# Altium schematic symbol library LATTICEPLDS_Library.SchLib: 291 symbols (part 11 of 32) (continued)
## LFE2M-70-F900 (continued)
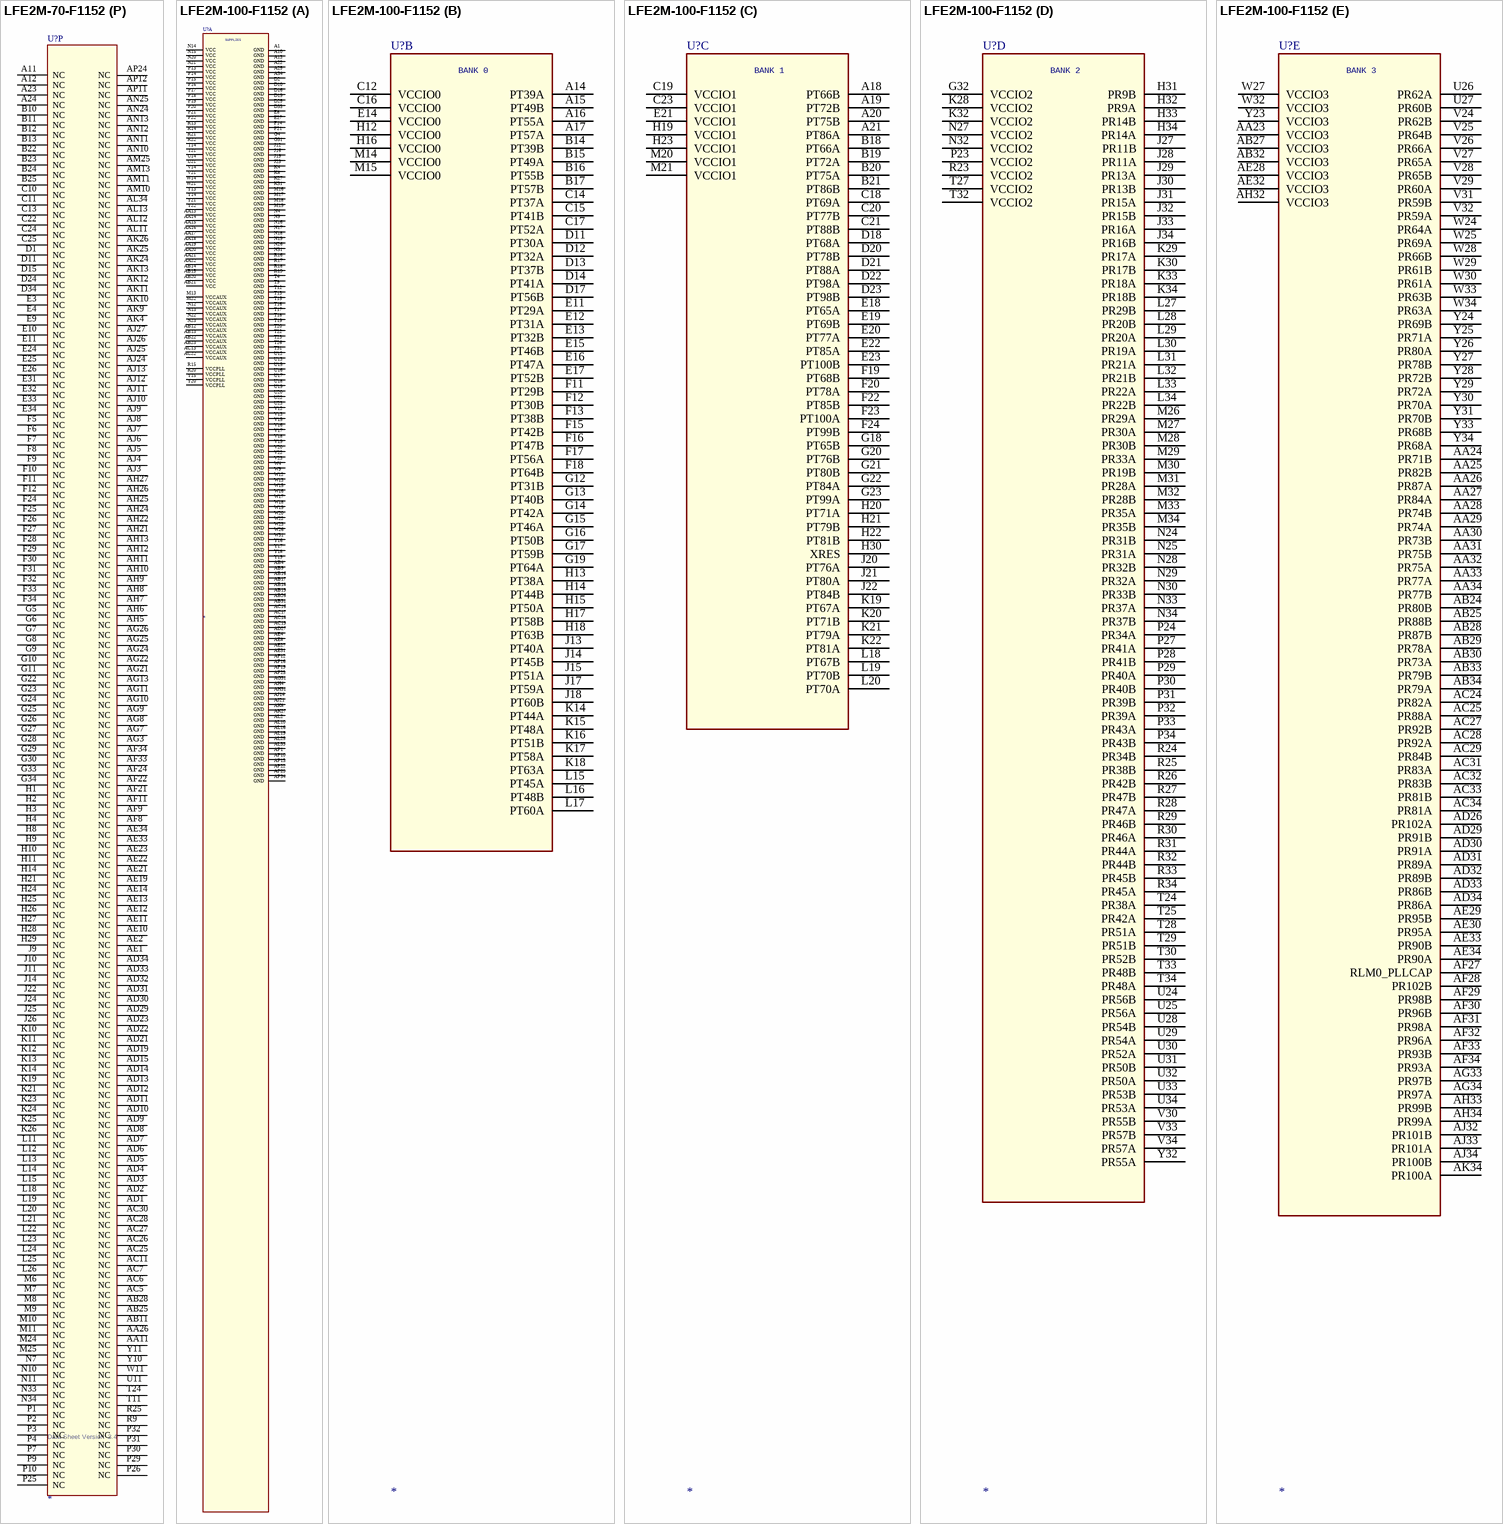
[diagram p117: symbols LFE2M-70-F1152 to LFE2M-100-F1152]
part A text: BANK7; BANK6; (1 of 10)
part B text: BANK5; BANK4; (2 of 10)
part C text: BANK3/BANK8; BANK2; (3 of 10)
part D text: BANK1; BANK0; (4 of 10)
part E text: (5 of 10)
part F text: SERDES4; (6 of 10)
part G text: SERDES3; (7 of 10)
part H text: SERDES2; (8 of 10)
part I text: SERDES1; (9 of 10)
part J text: VSS; (10 of 10)

## LFE2M-70-F1152
designator U?  Data Sheet Version: 3.4
SPLIT_INST: TRUE; SWAP_INFO: (S1+S2+S3+S4+S5+S6+S7+S8+S9+S10+S11+S12+S13+S14+S15)
part A pins: A1 GND (power), A10 GND (power), A13 GND (power), A22 GND (power), A25 GND (power), A34 GND (power), AA13 VCC (power), AA14 VCC (power), AA15 VCC (power), AA16 VCC (power), AA17 VCC (power), AA18 VCC (power), AA19 VCC (power), AA20 VCC (power), AA21 VCC (power), AA22 VCC (power), AB4 GND (power), AB9 GND (power), AB12 VCCAUX (power), AB13 VCCAUX (power), AB14 VCC (power), AB15 VCC (power), AB16 GND (power), AB17 GND (power), AB18 GND (power), AB19 GND (power), AB20 VCC (power), AB21 VCC (power), AB22 VCCAUX (power), AB23 VCCAUX (power), AB26 GND (power), AB31 GND (power), AC13 VCCAUX (power), AC16 GND (power), AC17 GND (power), AC18 GND (power), AC19 GND (power), AC22 VCCAUX (power), AD27 GND (power), AE4 GND (power), AE8 GND (power), AE27 GND (power), AE31 GND (power), AF12 GND (power), AF16 GND (power), AF19 GND (power), AF23 GND (power), AG31 GND (power), AH4 GND (power), AH31 GND (power), AJ14 GND (power), AJ21 GND (power), AK8 GND (power), AK27 GND (power), AL2 GND (power), AL10 GND (power), AL16 GND (power), AL19 GND (power), AL25 GND (power), AL33 GND (power), AP1 GND (power), AP10 GND (power), AP13 GND (power), AP22 GND (power), AP25 GND (power), AP34 GND (power), D2 GND (power), D10 GND (power), D16 GND (power), D19 GND (power), D25 GND (power), D33 GND (power), E8 GND (power), E27 GND (power), F14 GND (power), F21 GND (power), G4 GND (power), G31 GND (power), J12 GND (power), J16 GND (power), J19 GND (power), J23 GND (power), K4 GND (power), K8 GND (power), K27 GND (power), K31 GND (power), M13 VCCAUX (power), M16 GND (power), M17 GND (power), M18 GND (power), M19 GND (power), M22 VCCAUX (power), N4 GND (power), N9 GND (power), N12 VCCAUX (power), N13 VCCAUX (power), N14 VCC (power), N15 VCC (power), N16 GND (power), N17 GND (power), N18 GND (power), N19 GND (power), N20 VCC (power), N21 VCC (power), N22 VCCAUX (power), N23 VCCAUX (power), N26 GND (power), N31 GND (power), P13 VCC (power), P14 VCC (power), P15 VCC (power), P16 VCC (power), P17 VCC (power), P18 VCC (power), P19 VCC (power), P20 VCC (power), P21 VCC (power), P22 VCC (power), R13 VCC (power), R14 VCC (power), R15 VCCPLL (power), R16 GND (power), R17 GND (power), R18 GND (power), R19 GND (power), R20 VCCPLL (power), R21 VCC (power), R22 VCC (power), T4 GND (power), T9 GND (power), T12 GND (power), T13 GND (power), T14 VCC (power), T15 GND (power), T16 GND (power), T17 GND (power), T18 GND (power), T19 GND (power), T20 GND (power), T21 VCC (power), T22 GND (power), T23 GND (power), T26 GND (power), T31 GND (power), U12 GND (power), U13 GND (power), U14 VCC (power), U15 GND (power), U16 GND (power), U17 GND (power), U18 GND (power), U19 GND (power), U20 GND (power), U21 VCC (power), U22 GND (power), U23 GND (power), V12 GND (power), V13 GND (power), V14 VCC (power), V15 GND (power), V16 GND (power), V17 GND (power), V18 GND (power), V19 GND (power), V20 GND (power), V21 VCC (power), V22 GND (power), V23 GND (power), W4 GND (power), W9 GND (power), W12 GND (power), W13 GND (power), W14 VCC (power), W15 GND (power), W16 GND (power), W17 GND (power), W18 GND (power), W19 GND (power), W20 GND (power), W21 VCC (power), W22 GND (power), W23 GND (power), W26 GND (power), W31 GND (power), Y13 VCC (power), Y14 VCC (power), Y15 VCCPLL (power), Y16 GND (power), Y17 GND (power), Y18 GND (power), Y19 GND (power), Y20 VCCPLL (power), Y21 VCC (power), Y22 VCC (power)
part B pins: A14 PT35A, A15 PT44B, A16 PT48A, A17 PT50A, B14 PT35B, B15 PT44A, B16 PT48B, B17 PT50B, C12 VCCIO0 (power), C14 PT33A, C15 PT37B, C16 VCCIO0 (power), C17 PT47A, D12 PT32A, D13 PT33B, D14 PT37A, D17 PT49B, E12 PT31A, E13 PT32B, E14 VCCIO0 (power), E15 PT41B, E16 PT42A, E17 PT47B, F13 PT34B, F15 PT38B, F16 PT42B, F17 PT49A, F18 PT55B, G12 PT31B, G13 PT36B, G14 PT38A, G15 PT41A, G16 PT45B, G17 PT52B, G19 PT55A, H12 VCCIO0 (power), H13 PT34A, H15 PT45A, H16 VCCIO0 (power), H17 PT51B, H18 PT54B, J13 PT36A, J15 PT46A, J17 PT52A, J18 PT53B, K15 PT43A, K16 PT46B, K17 PT51A, K18 PT54A, L16 PT43B, L17 PT53A, M14 VCCIO0 (power), M15 VCCIO0 (power)
part C pins: A18 PT57B, A19 PT63B, A20 PT66B, A21 PT77A, B18 PT57A, B19 PT63A, B20 PT66A, B21 PT77B, C18 PT60A, C19 VCCIO1 (power), C20 PT68B, C21 PT79B, C23 VCCIO1 (power), D18 PT59A, D20 PT69B, D21 PT79A, D22 PT80A, D23 PT80B, E18 PT56A, E19 PT60B, E20 PT68A, E21 VCCIO1 (power), E22 PT76A, E23 PT82B, F19 PT59B, F20 PT69A, F22 PT76B, F23 PT82A, G18 PT56B, G20 PT67B, G21 PT71B, H19 VCCIO1 (power), H20 PT62A, H22 PT72B, H23 VCCIO1 (power), H30 XRES, J20 PT67A, J21 PT71A, K20 PT62B, K22 PT72A, M20 VCCIO1 (power), M21 VCCIO1 (power)
part D pins: G32 VCCIO2 (power), H31 PR9B, H32 PR9A, H33 PR14B, H34 PR14A, J27 PR11B, J28 PR11A, J29 PR13A, J30 PR13B, J31 PR15A, J32 PR15B, J33 PR16A, J34 PR16B, K28 VCCIO2 (power), K29 PR17A, K30 PR17B, K32 VCCIO2 (power), K33 PR18A, K34 PR18B, L27 PR25B, L28 PR20B, L29 PR20A, L30 PR19A, L31 PR21A, L32 PR21B, L33 PR22A, L34 PR22B, M26 PR25A, M27 PR26A, M28 PR26B, M29 PR29A, M30 PR19B, M31 PR24A, M32 PR24B, M33 PR31A, M34 PR31B, N24 PR27B, N25 PR27A, N27 VCCIO2 (power), N28 PR28B, N29 PR28A, N30 PR29B, N32 VCCIO2 (power), P23 VCCIO2 (power), P24 PR30A, P27 PR33A, P28 PR33B, P33 PR35A, P34 PR35B, R23 VCCIO2 (power), R24 PR30B, R26 PR34B, R27 PR39B, R28 PR39A, R29 PR38B, R30 PR38A, R31 PR36A, R32 PR36B, R33 PR37B, R34 PR37A, T25 PR34A, T27 VCCIO2 (power), T28 PR43A, T29 PR43B, T30 PR44B, T32 VCCIO2 (power), T33 PR40B, T34 PR40A, U24 PR48B, U25 PR48A, U28 PR46B, U29 PR46A, U30 PR44A, U31 PR42B, U32 PR42A, U33 PR45B, U34 PR45A, V30 PR47B, V33 PR49B, V34 PR49A, Y32 PR47A
part E pins: AA23 VCCIO3 (power), AA24 PR63B, AA25 PR74B, AA27 PR76A, AA28 PR66B, AA29 PR66A, AA30 PR65B, AA31 PR67B, AA32 PR67A, AA33 PR69A, AA34 PR69B, AB24 PR72B, AB27 VCCIO3 (power), AB29 PR70A, AB30 PR65A, AB32 VCCIO3 (power), AB33 PR71B, AB34 PR71A, AC24 PR74A, AC29 PR76B, AC31 PR75A, AC32 PR75B, AC33 PR73B, AC34 PR73A, AD26 PR85A, AE28 VCCIO3 (power), AE29 PR78B, AE30 PR78A, AE32 VCCIO3 (power), AF27 RLM0_PLLCAP, AF28 PR85B, AF29 PR81B, AF30 PR79B, AF31 PR81A, AF32 PR79A, AG33 PR80B, AG34 PR80A, AH32 VCCIO3 (power), AH33 PR82B, AH34 PR82A, AJ32 PR84B, AJ33 PR84A, AJ34 PR83B, AK34 PR83A, U26 PR54A, U27 PR52B, V24 PR54B, V25 PR56B, V26 PR58A, V27 PR57A, V28 PR57B, V29 PR52A, V31 PR51B, V32 PR51A, W24 PR56A, W25 PR61A, W27 VCCIO3 (power), W28 PR58B, W29 PR53B, W30 PR53A, W32 VCCIO3 (power), W33 PR55B, W34 PR55A, Y23 VCCIO3 (power), Y24 PR61B, Y25 PR63A, Y26 PR72A, Y27 PR70B, Y28 PR64B, Y29 PR64A, Y30 PR62A, Y31 PR62B, Y33 PR60B, Y34 PR60A
part F pins: AC20 VCCIO4 (power), AC21 VCCIO4 (power), AD18 PB58B, AD20 PB71A, AE18 PB62B, AE20 PB73A, AF18 PB58A, AF20 PB71B, AG18 PB62A, AG19 VCCIO4 (power), AG20 PB73B, AG23 VCCIO4 (power), AH18 PB63B, AH19 PB69A, AH20 PB72B, AH23 PB81B, AJ18 PB63A, AJ19 PB72A, AJ20 PB69B, AJ22 PB79B, AJ23 PB81A, AK18 PB64A, AK19 PB64B, AK20 PB66B, AK21 VCCIO4 (power), AK22 PB79A, AK23 PB80B, AL20 PB66A, AL21 PB67B, AL22 PB74B, AL23 PB80A, AL24 PB78B, AM19 VCCIO4 (power), AM20 PB60B, AM21 PB61B, AM22 PB74A, AM23 VCCIO4 (power), AM24 PB78A, AN19 PB59B, AN20 PB61A, AN21 PB65B, AN22 PB67A, AN23 PB77B, AP19 PB59A, AP20 PB60A, AP21 PB65A, AP23 PB77A
part G pins: AC14 VCCIO5 (power), AC15 VCCIO5 (power), AD16 PB44B, AD17 PB49A, AE15 PB36A, AE16 PB42B, AE17 PB49B, AF13 PB35B, AF14 PB35A, AF15 PB44A, AF17 PB53A, AG12 VCCIO5 (power), AG14 PB36B, AG15 PB42A, AG16 VCCIO5 (power), AG17 PB52A, AH14 PB31A, AH15 PB37A, AH16 PB45B, AH17 PB53B, AJ15 PB31B, AJ16 PB39B, AJ17 PB52B, AK14 VCCIO5 (power), AK15 PB37B, AK16 PB39A, AK17 PB45A, AL14 PB33A, AL15 PB38A, AL17 PB47A, AL18 PB50A, AM12 VCCIO5 (power), AM14 PB33B, AM15 PB38B, AM16 VCCIO5 (power), AM17 PB47B, AM18 PB50B, AN14 PB30A, AN15 PB40A, AN16 PB46A, AN17 PB48A, AN18 PB51B, AP14 PB30B, AP15 PB40B, AP16 PB46B, AP17 PB48B, AP18 PB51A
part H pins: AA1 PL64A, AA2 PL64B, AA3 PL67B, AA4 PL67A, AA5 PL70A, AA6 PL66A, AA7 PL66B, AA8 PL65A, AA9 PL69A, AA10 PL69B, AA12 VCCIO6 (power), AB1 PL71A, AB2 PL71B, AB3 VCCIO6 (power), AB5 PL74B, AB6 PL70B, AB7 PL74A, AB8 VCCIO6 (power), AB10 PL72B, AC1 PL73A, AC2 PL73B, AC3 PL75A, AC4 PL75B, AC8 PL72A, AC9 PL76B, AC10 PL76A, AE3 VCCIO6 (power), AE5 PL79A, AE6 PL79B, AE7 VCCIO6 (power), AE9 PL83A, AF1 PL78B, AF2 PL78A, AF3 PL80B, AF4 PL80A, AF5 PL81A, AF6 PL81B, AF7 PL83B, AG1 PL82A, AG2 PL82B, AG4 PL85B, AG5 PL85A, AG6 LLM0_PLLCAP, AH1 PL84A, AH2 PL84B, AH3 VCCIO6 (power), AJ1 PL87A, AJ2 PL87B, U1 PL51B, U2 PL51A, V1 PL55B, V2 PL55A, V3 PL54B, V4 PL54A, V5 PL52A, V6 PL52B, V7 PL53A, V8 PL53B, W1 PL57B, W2 PL57A, W3 VCCIO6 (power), W5 PL56B, W6 PL58B, W7 PL56A, W8 VCCIO6 (power), W10 PL62A, Y1 PL60A, Y2 PL60B, Y3 PL63B, Y4 PL63A, Y5 PL61B, Y6 PL58A, Y7 PL61A, Y8 PL62B, Y9 PL65B, Y12 VCCIO6 (power)
part I pins: E1 PL11A, E2 PL11B, F1 PL13A, F2 PL13B, F3 PL9B, F4 PL9A, G1 PL15B, G2 PL15A, G3 VCCIO7 (power), H5 PL18A, H6 PL14B, H7 PL12B, J1 PL19B, J2 PL19A, J3 PL21B, J4 PL21A, J5 PL22A, J6 PL18B, J7 PL16A, J8 PL14A, K1 PL20B, K2 PL20A, K3 VCCIO7 (power), K5 PL22B, K6 PL25B, K7 VCCIO7 (power), K9 PL12A, L1 PL24B, L2 PL24A, L3 PL28A, L4 PL28B, L5 PL27B, L6 PL27A, L7 PL25A, L8 PL16B, L9 PL17A, L10 PL17B, M1 PL26B, M2 PL26A, M3 PL29A, M4 PL29B, M5 PL31A, N1 PL30A, N2 PL30B, N3 VCCIO7 (power), N5 PL33B, N6 PL31B, N8 VCCIO7 (power), P5 PL33A, P6 PL34B, P8 PL34A, P11 PL36B, P12 VCCIO7 (power), R1 PL39A, R2 PL39B, R3 PL35A, R4 PL35B, R5 PL38A, R6 PL44B, R7 PL37A, R8 PL37B, R10 PL36A, R11 PL40A, R12 VCCIO7 (power), T1 PL42A, T2 PL42B, T3 VCCIO7 (power), T5 PL38B, T6 PL44A, T7 PL45B, T8 VCCIO7 (power), T10 PL40B, U3 PL49B, U4 PL49A, U5 PL46A, U6 PL46B, U7 PL47A, U8 PL43B, U9 PL45A, U10 PL43A, V9 PL47B, V10 PL48B, V11 PL48A
part J pins: AD24 CFG1, AD25 CSN, AD28 VCCIO8 (power), AE24 WRITEN, AE25 INITN, AE26 D6, AF25 PROGRAMN, AF26 D4, AG27 DI, AG28 D1, AG29 D0, AG30 D2, AG32 VCCIO8 (power), AH28 CFG2, AH29 D3, AH30 D5, AJ28 CCLK, AJ29 CFG0, AJ30 CS1N, AJ31 D7, AK31 DONE, AK32 DOUT_CSON, AK33 BUSY
part K pins: AF10 TDO, AK1 TDI, AK2 TCK (in), AK3 VCCJ, AL1 TMS
part L pins: A2 ULC_SQ_HDOUTP3, A3 ULC_SQ_HDOUTN3, A4 ULC_SQ_HDOUTN2, A5 ULC_SQ_HDOUTP2, A6 ULC_SQ_HDOUTP1, A7 ULC_SQ_HDOUTN1, A8 ULC_SQ_HDOUTN0, A9 ULC_SQ_HDOUTP0, B1 ULC_SQ_VCCIB3, B2 ULC_SQ_VCCRX3, B3 ULC_SQ_VCCTX3, B4 ULC_SQ_VCCTX2, B5 ULC_SQ_VCCRX2, B6 ULC_SQ_VCCRX1, B7 ULC_SQ_VCCTX1, B8 ULC_SQ_VCCTX0, B9 ULC_SQ_VCCIB0, C1 ULC_SQ_VCCOB3, C2 ULC_SQ_HDINP3, C3 ULC_SQ_HDINN3, C4 ULC_SQ_HDINN2, C5 ULC_SQ_HDINP2, C6 ULC_SQ_HDINP1, C7 ULC_SQ_HDINN1, C8 ULC_SQ_HDINN0, C9 ULC_SQ_HDINP0, D3 ULC_SQ_VCCOB2, D4 ULC_SQ_VCCIB2, D5 ULC_SQ_REFCLKP, D6 ULC_SQ_VCCP, D7 ULC_SQ_VCCRX0, D8 ULC_SQ_VCCIB1, D9 ULC_SQ_VCCOB0, E5 ULC_SQ_REFCLKN, E6 ULC_SQ_VCCAUX33, E7 ULC_SQ_VCCOB1
part M pins: A26 URC_SQ_HDOUTP3, A27 URC_SQ_HDOUTN3, A28 URC_SQ_HDOUTN2, A29 URC_SQ_HDOUTP2, A30 URC_SQ_HDOUTP1, A31 URC_SQ_HDOUTN1, A32 URC_SQ_HDOUTN0, A33 URC_SQ_HDOUTP0, B26 URC_SQ_VCCIB3, B27 URC_SQ_VCCTX3, B28 URC_SQ_VCCTX2, B29 URC_SQ_VCCRX2, B30 URC_SQ_VCCRX1, B31 URC_SQ_VCCTX1, B32 URC_SQ_VCCTX0, B33 URC_SQ_VCCRX0, B34 URC_SQ_VCCIB0, C26 URC_SQ_HDINP3, C27 URC_SQ_HDINN3, C28 URC_SQ_HDINN2, C29 URC_SQ_HDINP2, C30 URC_SQ_HDINP1, C31 URC_SQ_HDINN1, C32 URC_SQ_HDINN0, C33 URC_SQ_HDINP0, C34 URC_SQ_VCCOB0, D26 URC_SQ_VCCOB3, D27 URC_SQ_VCCIB2, D28 URC_SQ_VCCRX3, D29 URC_SQ_VCCP, D30 URC_SQ_REFCLKP, D31 URC_SQ_VCCIB1, D32 URC_SQ_VCCOB1, E28 URC_SQ_VCCOB2, E29 URC_SQ_VCCAUX33, E30 URC_SQ_REFCLKN
part N pins: AK28 LRC_SQ_VCCOB2, AK29 LRC_SQ_VCCAUX33, AK30 LRC_SQ_REFCLKN, AL26 LRC_SQ_VCCOB3, AL27 LRC_SQ_VCCIB2, AL28 LRC_SQ_VCCRX3, AL29 LRC_SQ_VCCP, AL30 LRC_SQ_REFCLKP, AL31 LRC_SQ_VCCIB1, AL32 LRC_SQ_VCCOB1, AM26 LRC_SQ_HDINP3, AM27 LRC_SQ_HDINN3, AM28 LRC_SQ_HDINN2, AM29 LRC_SQ_HDINP2, AM30 LRC_SQ_HDINP1, AM31 LRC_SQ_HDINN1, AM32 LRC_SQ_HDINN0, AM33 LRC_SQ_HDINP0, AM34 LRC_SQ_VCCOB0, AN26 LRC_SQ_VCCIB3, AN27 LRC_SQ_VCCTX3, AN28 LRC_SQ_VCCTX2, AN29 LRC_SQ_VCCRX2, AN30 LRC_SQ_VCCRX1, AN31 LRC_SQ_VCCTX1, AN32 LRC_SQ_VCCTX0, AN33 LRC_SQ_VCCRX0, AN34 LRC_SQ_VCCIB0, AP26 LRC_SQ_HDOUTP3, AP27 LRC_SQ_HDOUTN3, AP28 LRC_SQ_HDOUTN2, AP29 LRC_SQ_HDOUTP2, AP30 LRC_SQ_HDOUTP1, AP31 LRC_SQ_HDOUTN1, AP32 LRC_SQ_HDOUTN0, AP33 LRC_SQ_HDOUTP0
part O pins: AK5 LLC_SQ_REFCLKN, AK6 LLC_SQ_VCCAUX33, AK7 LLC_SQ_VCCOB1, AL3 LLC_SQ_VCCOB2, AL4 LLC_SQ_VCCIB2, AL5 LLC_SQ_REFCLKP, AL6 LLC_SQ_VCCP, AL7 LLC_SQ_VCCRX0, AL8 LLC_SQ_VCCIB1, AL9 LLC_SQ_VCCOB0, AM1 LLC_SQ_VCCOB3, AM2 LLC_SQ_HDINP3, AM3 LLC_SQ_HDINN3, AM4 LLC_SQ_HDINN2, AM5 LLC_SQ_HDINP2, AM6 LLC_SQ_HDINP1, AM7 LLC_SQ_HDINN1, AM8 LLC_SQ_HDINN0, AM9 LLC_SQ_HDINP0, AN1 LLC_SQ_VCCIB3, AN2 LLC_SQ_VCCRX3, AN3 LLC_SQ_VCCTX3, AN4 LLC_SQ_VCCTX2, AN5 LLC_SQ_VCCRX2, AN6 LLC_SQ_VCCRX1, AN7 LLC_SQ_VCCTX1, AN8 LLC_SQ_VCCTX0, AN9 LLC_SQ_VCCIB0, AP2 LLC_SQ_HDOUTP3, AP3 LLC_SQ_HDOUTN3, AP4 LLC_SQ_HDOUTN2, AP5 LLC_SQ_HDOUTP2, AP6 LLC_SQ_HDOUTP1, AP7 LLC_SQ_HDOUTN1, AP8 LLC_SQ_HDOUTN0, AP9 LLC_SQ_HDOUTP0
part P pins: A11 NC, A12 NC, A23 NC, A24 NC, AA11 NC, AA26 NC, AB11 NC, AB25 NC, AB28 NC, AC5 NC, AC6 NC, AC7 NC, AC11 NC, AC25 NC, AC26 NC, AC27 NC, AC28 NC, AC30 NC, AD1 NC, AD2 NC, AD3 NC, AD4 NC, AD5 NC, AD6 NC, AD7 NC, AD8 NC, AD9 NC, AD10 NC, AD11 NC, AD12 NC, AD13 NC, AD14 NC, AD15 NC, AD19 NC, AD21 NC, AD22 NC, AD23 NC, AD29 NC, AD30 NC, AD31 NC, AD32 NC, AD33 NC, AD34 NC, AE1 NC, AE2 NC, AE10 NC, AE11 NC, AE12 NC, AE13 NC, AE14 NC, AE19 NC, AE21 NC, AE22 NC, AE23 NC, AE33 NC, AE34 NC, AF8 NC, AF9 NC, AF11 NC, AF21 NC, AF22 NC, AF24 NC, AF33 NC, AF34 NC, AG3 NC, AG7 NC, AG8 NC, AG9 NC, AG10 NC, AG11 NC, AG13 NC, AG21 NC, AG22 NC, AG24 NC, AG25 NC, AG26 NC, AH5 NC, AH6 NC, AH7 NC, AH8 NC, AH9 NC, AH10 NC, AH11 NC, AH12 NC, AH13 NC, AH21 NC, AH22 NC, AH24 NC, AH25 NC, AH26 NC, AH27 NC, AJ3 NC, AJ4 NC, AJ5 NC, AJ6 NC, AJ7 NC, AJ8 NC, AJ9 NC, AJ10 NC, AJ11 NC, AJ12 NC, AJ13 NC, AJ24 NC, AJ25 NC, AJ26 NC, AJ27 NC, AK4 NC, AK9 NC, AK10 NC, AK11 NC, AK12 NC, AK13 NC, AK24 NC, AK25 NC, AK26 NC, AL11 NC, AL12 NC, AL13 NC, AL34 NC, AM10 NC, AM11 NC, AM13 NC, AM25 NC, AN10 NC, AN11 NC, AN12 NC, AN13 NC, AN24 NC, AN25 NC, AP11 NC, AP12 NC, AP24 NC, B10 NC, B11 NC, B12 NC, B13 NC, B22 NC, B23 NC, B24 NC, B25 NC, C10 NC, C11 NC, C13 NC, C22 NC, C24 NC, C25 NC, D1 NC, D11 NC, D15 NC, D24 NC, D34 NC, E3 NC, E4 NC, E9 NC, E10 NC, E11 NC, E24 NC, E25 NC, E26 NC, E31 NC, E32 NC, E33 NC, E34 NC, F5 NC, F6 NC, F7 NC, F8 NC, F9 NC, F10 NC, F11 NC, F12 NC, F24 NC, F25 NC, F26 NC, F27 NC, F28 NC, F29 NC, F30 NC, F31 NC, F32 NC, F33 NC, F34 NC, G5 NC, G6 NC, G7 NC, G8 NC, G9 NC, G10 NC, G11 NC, G22 NC, G23 NC, G24 NC, G25 NC, G26 NC, G27 NC, G28 NC, G29 NC, G30 NC, G33 NC, G34 NC, H1 NC, H2 NC, H3 NC, H4 NC, H8 NC, H9 NC, H10 NC, H11 NC, H14 NC, H21 NC, H24 NC, H25 NC, H26 NC, H27 NC, H28 NC, H29 NC, J9 NC, J10 NC, J11 NC, J14 NC, J22 NC, J24 NC, J25 NC, J26 NC, K10 NC, K11 NC, K12 NC, K13 NC, K14 NC, K19 NC, K21 NC, K23 NC, K24 NC, K25 NC, K26 NC, L11 NC, L12 NC, L13 NC, L14 NC, L15 NC, L18 NC, L19 NC, L20 NC, L21 NC, L22 NC, L23 NC, L24 NC, L25 NC, L26 NC, M6 NC, M7 NC, M8 NC, M9 NC, M10 NC, M11 NC, M24 NC, M25 NC, N7 NC, N10 NC, N11 NC, N33 NC, N34 NC, P1 NC, P2 NC, P3 NC, P4 NC, P7 NC, P9 NC, P10 NC, P25 NC, P26 NC, P29 NC, P30 NC, P31 NC, P32 NC, R9 NC, R25 NC, T11 NC, T24 NC, U11 NC, W11 NC, Y10 NC, Y11 NC
part A text: SUPPLIES
part B text: BANK 0
part C text: BANK 1
part D text: BANK 2
part E text: BANK 3
part F text: BANK 4
part G text: BANK 5
part H text: BANK 6
part I text: BANK 7
part J text: BANK 8
part K text: JTAG
part L text: SERDES
part M text: SERDES
part N text: SERDES
part O text: SERDES

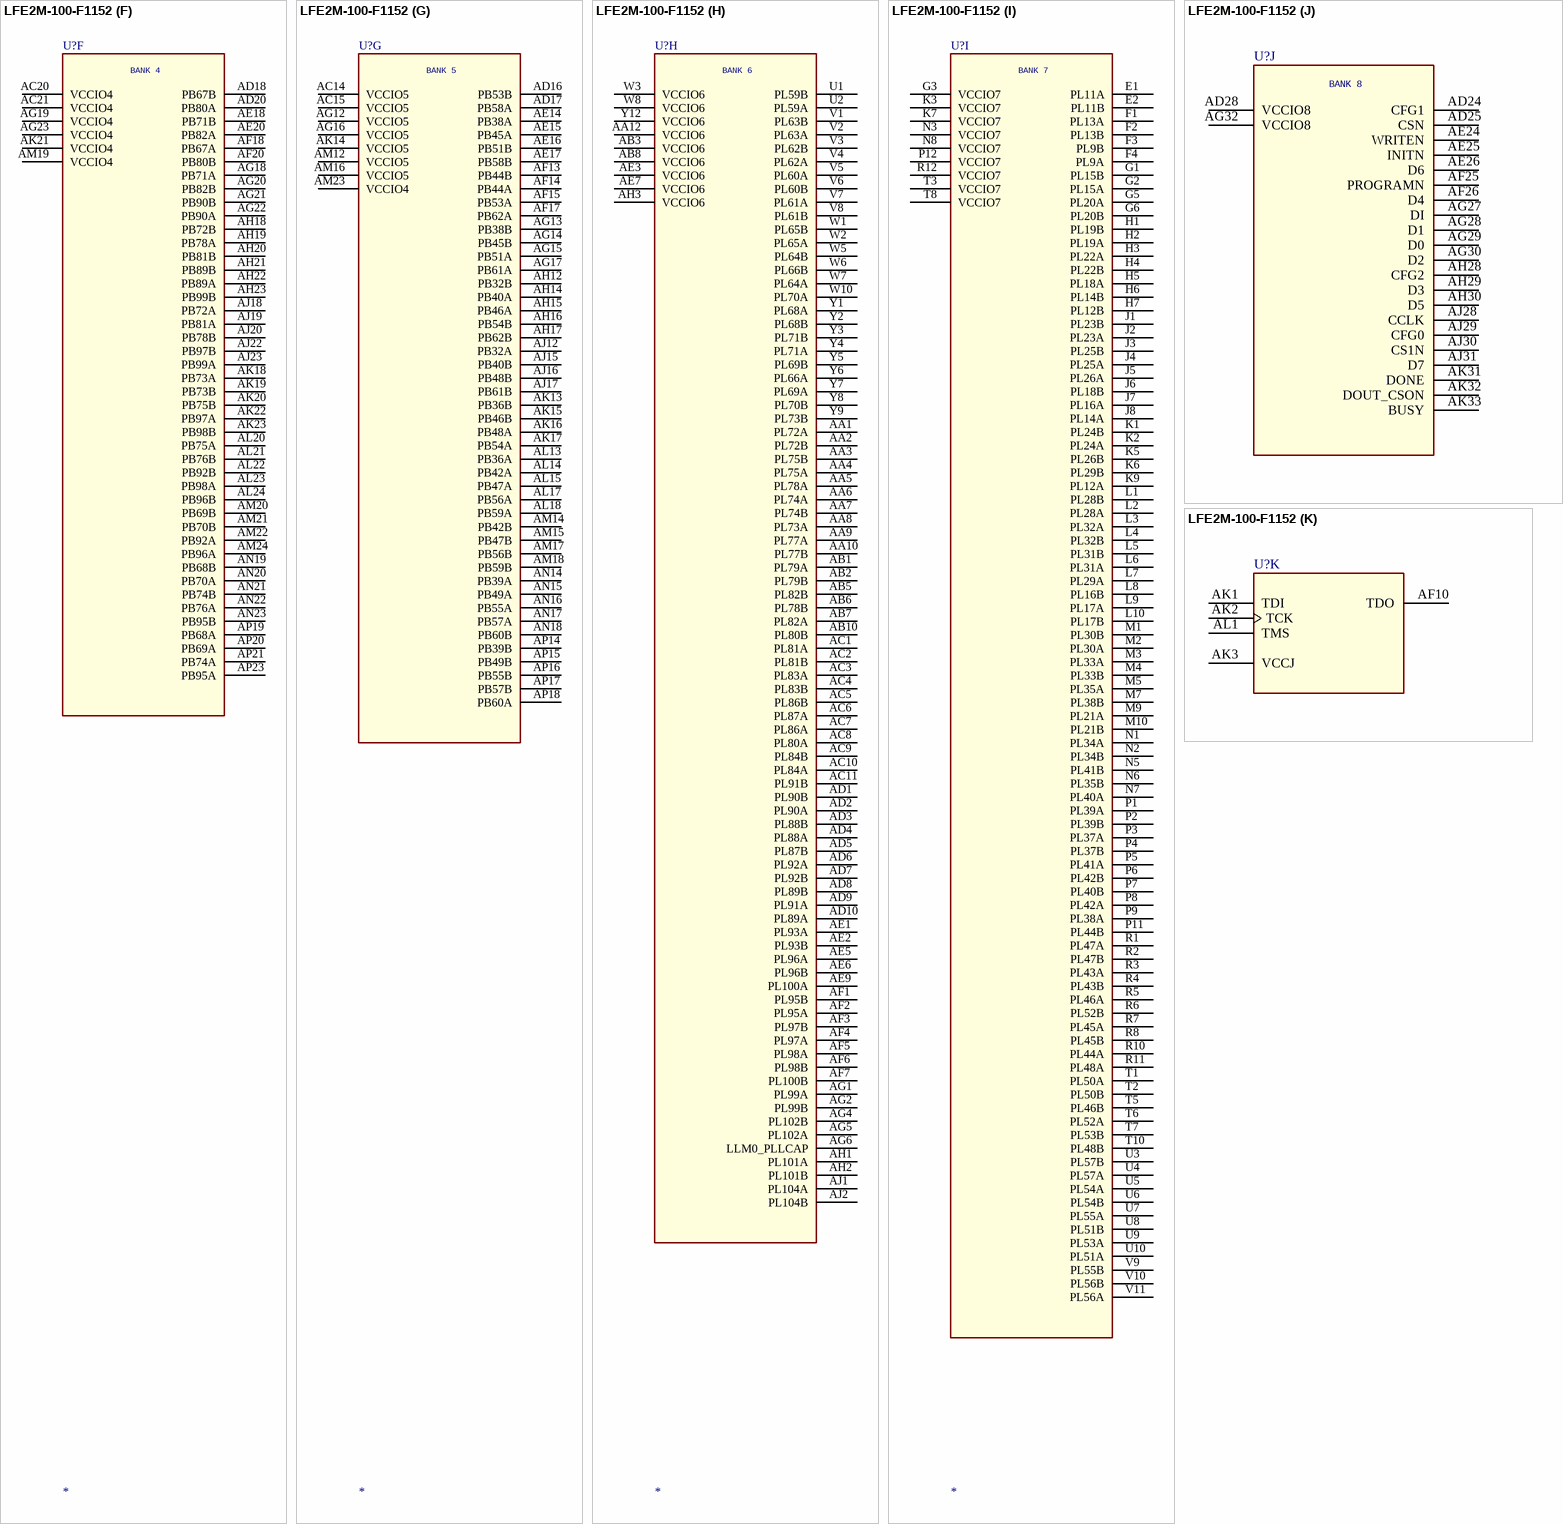
[diagram p118: symbol LFE2M-100-F1152]

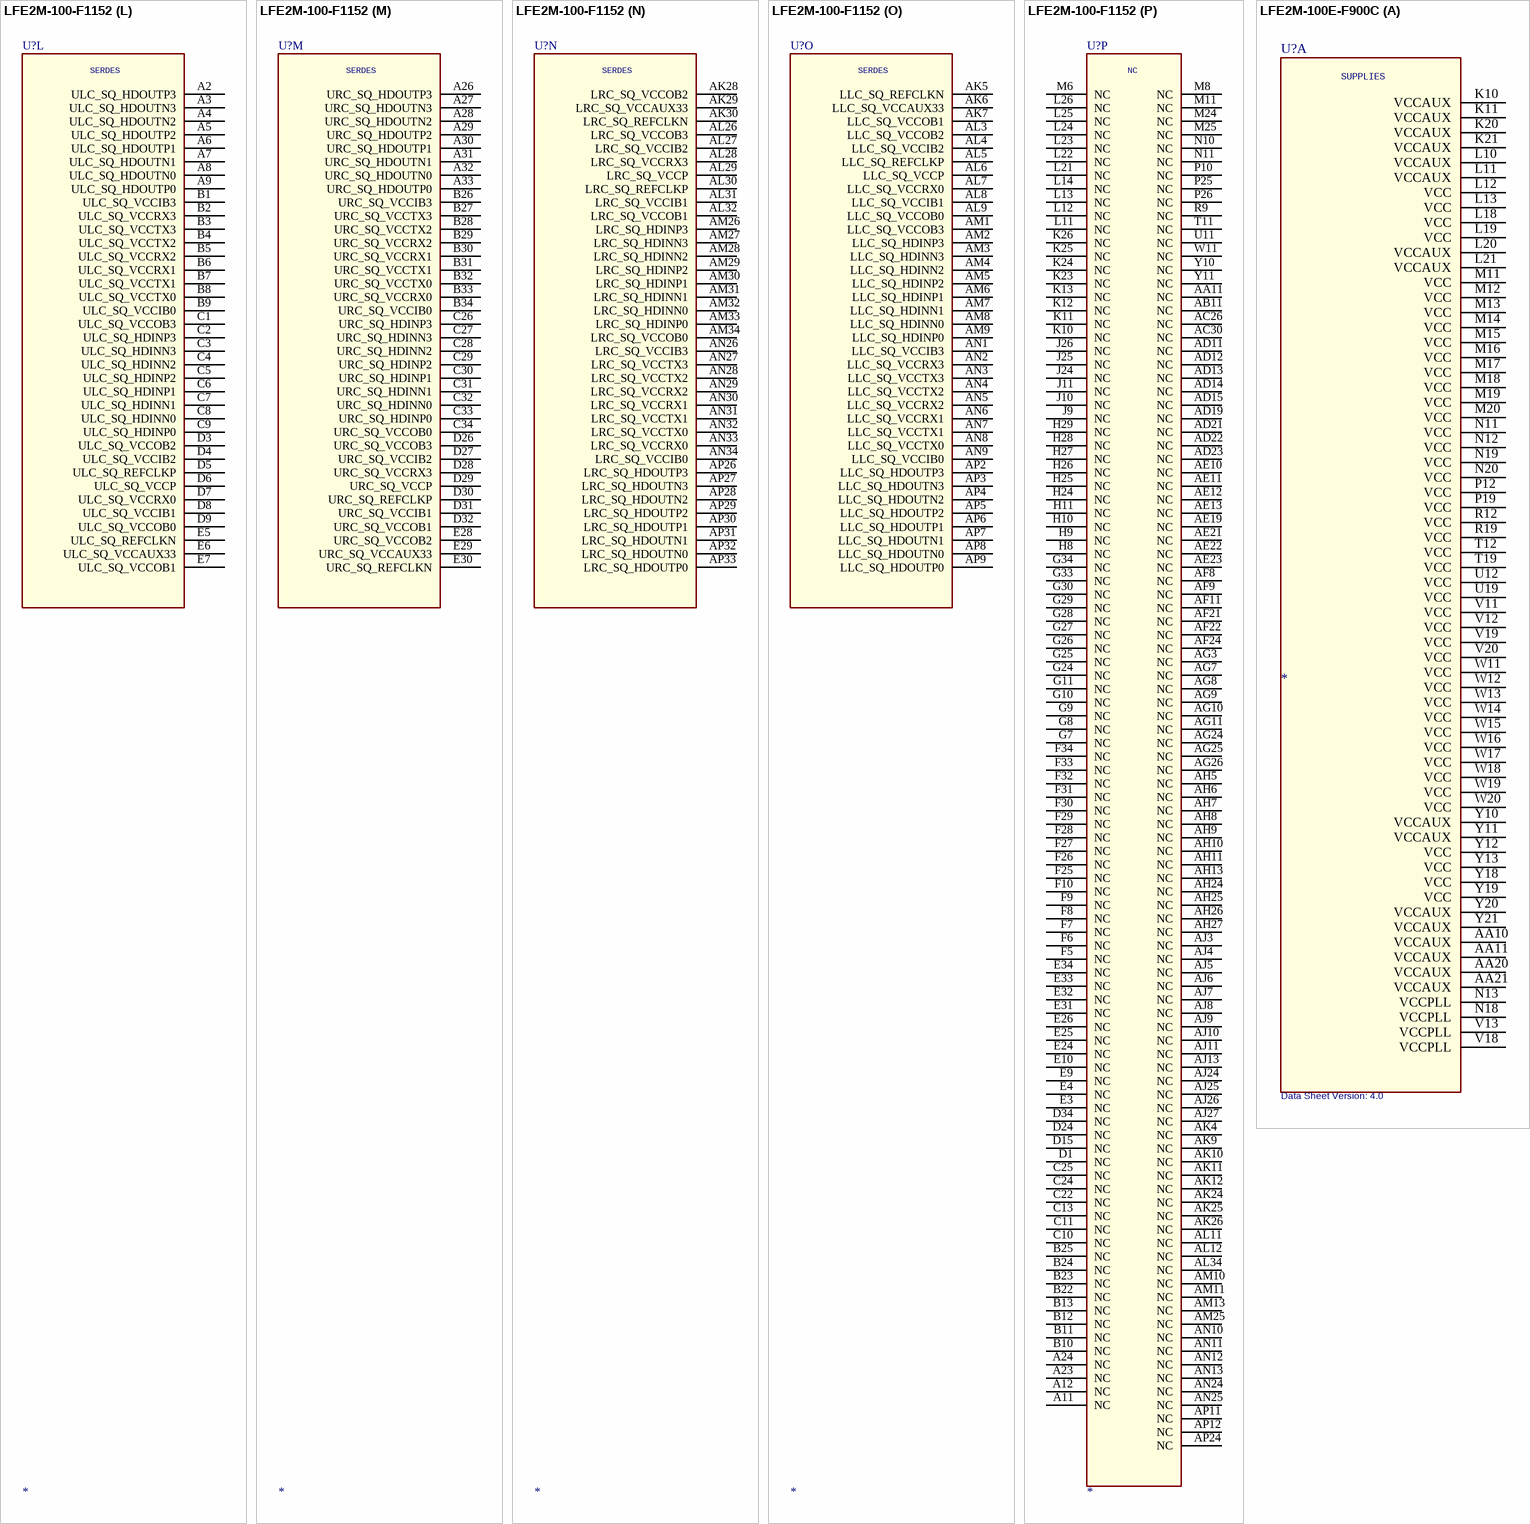
[diagram p119: symbols LFE2M-100-F1152 to LFE2M-100E-F900C]

## LFE2M-100-F1152
designator U?
SWAP_INFO: (S1+S2+S3+S4+S5+S6+S7+S8+S9+S10+S11+S12+S13+S14+S15); SPLIT_INST: TRUE
part A pins: A1 GND (power), A10 GND (power), A13 GND (power), A22 GND (power), A25 GND (power), A34 GND (power), AA13 VCC (power), AA14 VCC (power), AA15 VCC (power), AA16 VCC (power), AA17 VCC (power), AA18 VCC (power), AA19 VCC (power), AA20 VCC (power), AA21 VCC (power), AA22 VCC (power), AB4 GND (power), AB9 GND (power), AB12 VCCAUX (power), AB13 VCCAUX (power), AB14 VCC (power), AB15 VCC (power), AB16 GND (power), AB17 GND (power), AB18 GND (power), AB19 GND (power), AB20 VCC (power), AB21 VCC (power), AB22 VCCAUX (power), AB23 VCCAUX (power), AB26 GND (power), AB31 GND (power), AC13 VCCAUX (power), AC16 GND (power), AC17 GND (power), AC18 GND (power), AC19 GND (power), AC22 VCCAUX (power), AD27 GND (power), AE4 GND (power), AE8 GND (power), AE27 GND (power), AE31 GND (power), AF12 GND (power), AF16 GND (power), AF19 GND (power), AF23 GND (power), AG31 GND (power), AH4 GND (power), AH31 GND (power), AJ14 GND (power), AJ21 GND (power), AK8 GND (power), AK27 GND (power), AL2 GND (power), AL10 GND (power), AL16 GND (power), AL19 GND (power), AL25 GND (power), AL33 GND (power), AP1 GND (power), AP10 GND (power), AP13 GND (power), AP22 GND (power), AP25 GND (power), AP34 GND (power), D2 GND (power), D10 GND (power), D16 GND (power), D19 GND (power), D25 GND (power), D33 GND (power), E8 GND (power), E27 GND (power), F14 GND (power), F21 GND (power), G4 GND (power), G31 GND (power), J12 GND (power), J16 GND (power), J19 GND (power), J23 GND (power), K4 GND (power), K8 GND (power), K27 GND (power), K31 GND (power), M13 VCCAUX (power), M16 GND (power), M17 GND (power), M18 GND (power), M19 GND (power), M22 VCCAUX (power), N4 GND (power), N9 GND (power), N12 VCCAUX (power), N13 VCCAUX (power), N14 VCC (power), N15 VCC (power), N16 GND (power), N17 GND (power), N18 GND (power), N19 GND (power), N20 VCC (power), N21 VCC (power), N22 VCCAUX (power), N23 VCCAUX (power), N26 GND (power), N31 GND (power), P13 VCC (power), P14 VCC (power), P15 VCC (power), P16 VCC (power), P17 VCC (power), P18 VCC (power), P19 VCC (power), P20 VCC (power), P21 VCC (power), P22 VCC (power), R13 VCC (power), R14 VCC (power), R15 VCCPLL (power), R16 GND (power), R17 GND (power), R18 GND (power), R19 GND (power), R20 VCCPLL (power), R21 VCC (power), R22 VCC (power), T4 GND (power), T9 GND (power), T12 GND (power), T13 GND (power), T14 VCC (power), T15 GND (power), T16 GND (power), T17 GND (power), T18 GND (power), T19 GND (power), T20 GND (power), T21 VCC (power), T22 GND (power), T23 GND (power), T26 GND (power), T31 GND (power), U12 GND (power), U13 GND (power), U14 VCC (power), U15 GND (power), U16 GND (power), U17 GND (power), U18 GND (power), U19 GND (power), U20 GND (power), U21 VCC (power), U22 GND (power), U23 GND (power), V12 GND (power), V13 GND (power), V14 VCC (power), V15 GND (power), V16 GND (power), V17 GND (power), V18 GND (power), V19 GND (power), V20 GND (power), V21 VCC (power), V22 GND (power), V23 GND (power), W4 GND (power), W9 GND (power), W12 GND (power), W13 GND (power), W14 VCC (power), W15 GND (power), W16 GND (power), W17 GND (power), W18 GND (power), W19 GND (power), W20 GND (power), W21 VCC (power), W22 GND (power), W23 GND (power), W26 GND (power), W31 GND (power), Y13 VCC (power), Y14 VCC (power), Y15 VCCPLL (power), Y16 GND (power), Y17 GND (power), Y18 GND (power), Y19 GND (power), Y20 VCCPLL (power), Y21 VCC (power), Y22 VCC (power)